# Altium footprint library mmyLibrary.PcbLib: 231 footprints (part 9 of 15)
Each footprint in its own frame and in the unit in brackets; x right, y up, seen from the top. Pads: shape width x height; smd on the part's side, far side on the other; paste and mask are expansions set on the pad; w line width, h text height; cw(c..) or ccw(c..) is an arc to the next point about the centre after c.
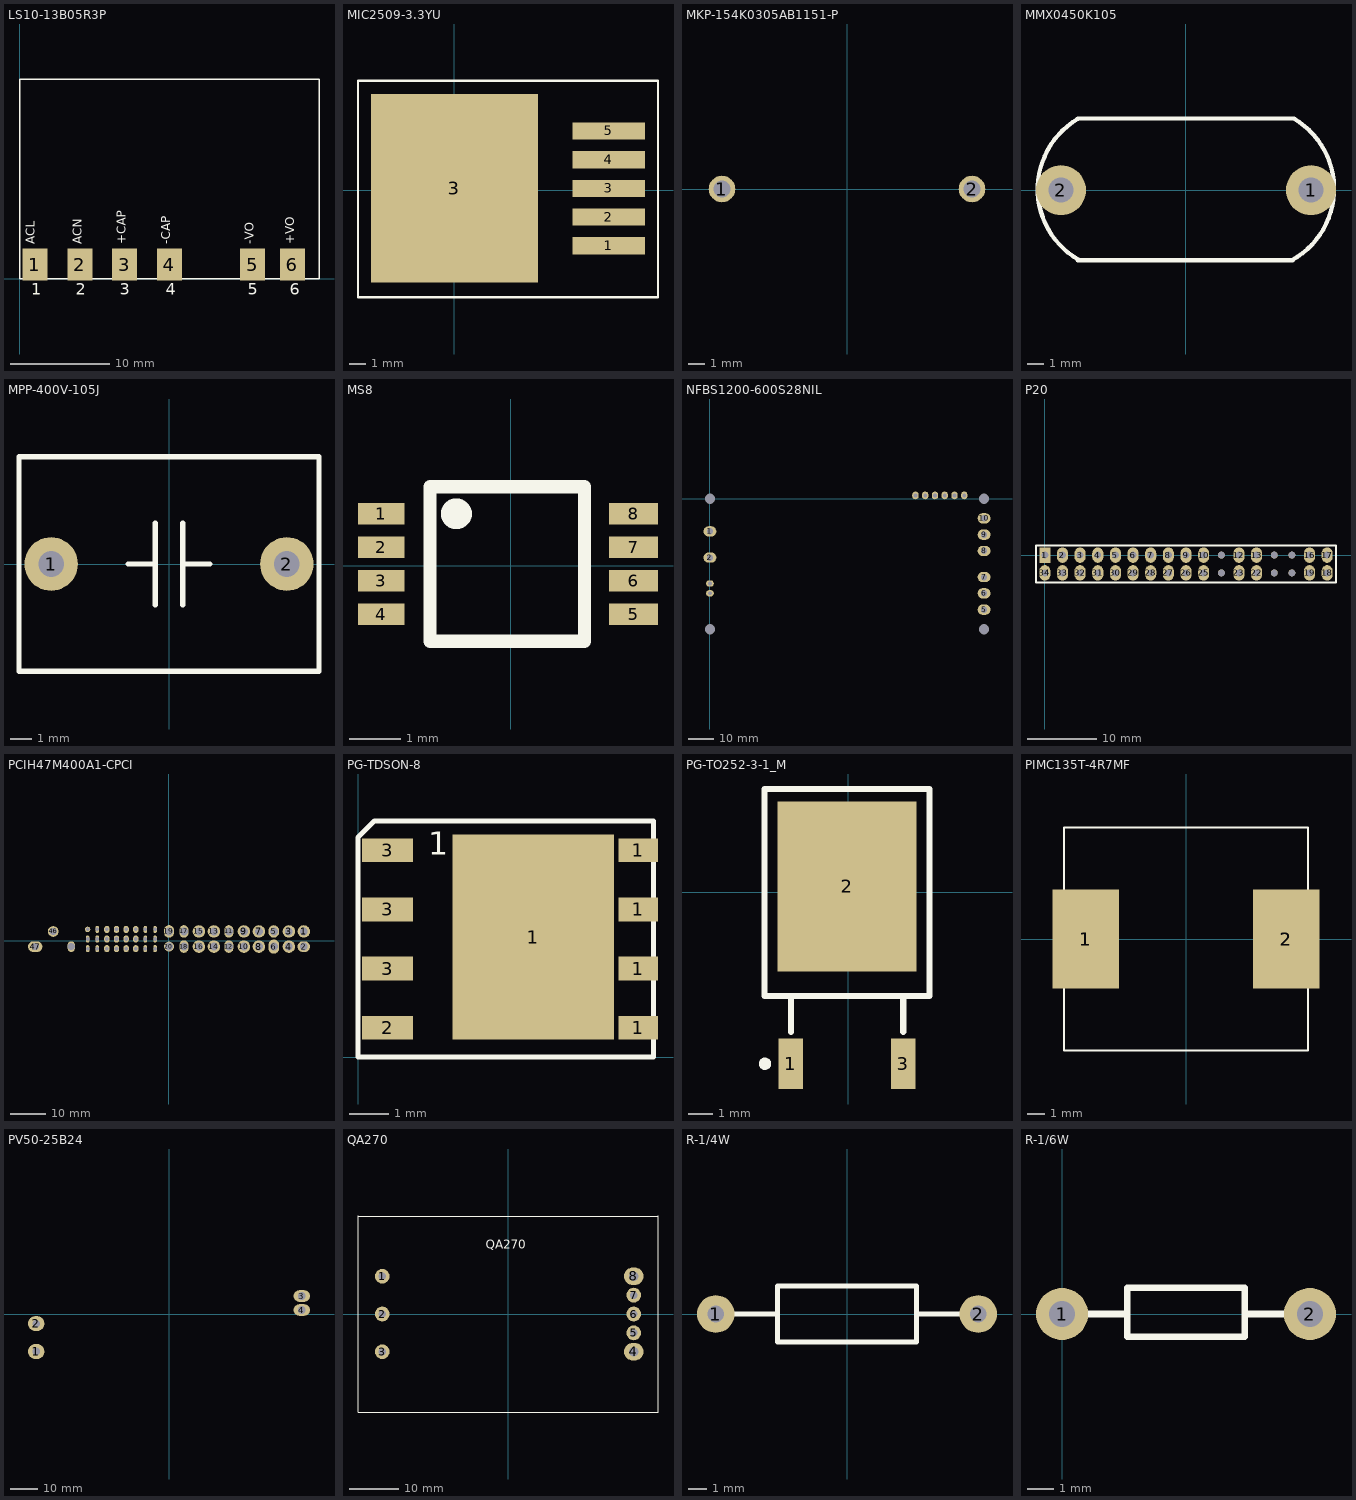
[diagram p8: the footprints below, top view; thin cyan lines are the x and y axes]

## LS10-13B05R3P [mm] "金升阳"
pads (6):
  rect 2.5x3.2 smd: 1(1.5,1.4) 2(6,1.4) 3(10.5,1.4) 4(15,1.4) 5(23.34,1.4) 6(27.34,1.4)
Top Overlay:
  lines w0.127: 0,0 30,0 30,20 0,20 0,0
  text "-CAP" at 15.367,3.429 h1.5
  text "+CAP" at 10.922,3.429 h1.5
  text "ACN" at 6.477,3.429 h1.5
  text "ACL" at 1.778,3.429 h1.5
  text "1" at 1.143,-2.032 h2
  text "2" at 5.588,-2.032 h2
  text "3" at 10.033,-2.032 h2
  text "4" at 14.605,-2.032 h2
  text "5" at 22.86,-2.032 h2
  text "6" at 27.051,-2.032 h2
  text "-VO" at 23.749,3.429 h1.5
  text "+VO" at 27.813,3.429 h1.5

## MIC2509-3.3YU [mm]
pads (6):
  rect 4.32x1.02 smd: 1(9.144,-3.298) 2(9.144,-1.598) 3(9.144,0.102) 4(9.144,1.802) 5(9.144,3.502)
  rect 9.91x11.18 smd: 3(-0.001,0.102)
Top Overlay:
  lines w0.127: -5.715,-6.35 12.065,-6.35 12.065,6.477 -5.715,6.477 -5.715,-6.35

## MKP-154K0305AB1151-P [mm]
pads (2):
  round 1.6 hole 1: 1(-7.5,0) 2(7.5,0)
Bottom Overlay:
  lines w0.254: -6.333,-0.04 -0.745,-0.04 ; -0.745,-1.818 -0.745,1.992 ; 1.16,-1.818 1.16,1.992 ; 1.287,-0.04 6.367,-0.04 ; -9,-2.5 -9,2.5 9,2.5 9,-2.5 -9,-2.5

## MMX0450K105 [mm]
pads (2):
  round 3 hole 1.5: 1(7.5,0) 2(-7.5,0)
Top Overlay:
  lines w0.254: -6.487,4.277 ccw(c-4.014,0.065) -6.442,-4.174 ; 6.347,-4.203 ccw(c4,0.081) 6.49,4.283
  lines w0.256: -6.5,-4.2 6.4,-4.2 ; -6.5,4.3 6.4,4.3

## MPP-400V-105J [mm]
pads (2):
  round 2.5 hole 1.2: 1(-5.5,0) 2(5.5,0)
Top Overlay:
  lines w0.254: -1.905,0 -0.635,0 ; -0.635,-1.905 -0.635,1.905 ; 0.635,-1.905 0.635,1.905 ; 0.635,0 1.905,0 ; -7,-5 7,-5 7,5 -7,5 -7,-5

## MS8 [mm]
pads (8):
  rect 0.9x0.42 smd: 1(-2.52,1.006) 2(-2.52,0.356) 3(-2.52,-0.294) 4(-2.52,-0.944)
  rect 0.95x0.42 smd: 5(2.38,-0.944) 6(2.38,-0.294) 7(2.38,0.356) 8(2.38,1.006)
Top Overlay:
  circle w0.3: c-1.059,1.006 r0.15
  lines w0.254: -1.57,-1.469 1.43,-1.469 1.43,1.531 -1.57,1.531 -1.57,-1.469

## NFBS1200-600S28NIL [mm] "皓文模块"
pads (20):
  round 2.4 hole 4: 0(0,-50.8) 0(0,0) 0(106.7,-50.8) 0(106.7,0)
  oval 5x4 hole 2.5: 1(0,-12.7) 2(0,-22.9) 5(106.7,-43.2) 6(106.7,-36.8) 7(106.7,-30.5) 8(106.7,-20.3) 9(106.7,-14) 10(106.7,-7.6)
  oval 3x2.5 hole 1.5: 3(0,-33) 4(0,-36.8)
  oval 2.5x3 hole 1.5: 11(99,1.3) 12(95.2,1.3) 13(91.4,1.3) 14(87.6,1.3) 15(83.8,1.3) 16(80,1.3)
Bottom Overlay:
  lines w0.127: -5.05,-55.9 -5.05,5.1 111.75,5.1 111.75,-55.9 -5.05,-55.9
  text "-VO" at 97.673,-8.763 h3
  text "-VO" at 97.673,-14.351 h3
  text "-VO" at 97.8,-20.955 h3
  text "+VO" at 97.292,-31.623 h3
  text "+VO" at 97.292,-37.846 h3
  text "+VO" at 97.292,-44.069 h3
  text "+VIN" at 3.82,-23.876 h4
  text "-VIN" at 3.82,-13.716 h4
  text "-ON/OFF" at 2.677,-33.909 h3
  text "+ON/OFF" at 2.55,-37.719 h3
  text "-S" at 99.578,-4.064 h3
  text "+S" at 96.022,-4.572 h3
  text "TRIM" at 92.212,-8.382 h3
  text "PC/NC" at 88.402,-9.271 h3
  text "IOG" at 84.592,-6.731 h3
  text "AUX" at 80.782,-6.985 h3
  text "1" at -4.308,-13.589 h2
  text "2" at -4.308,-23.622 h2
  text "3" at -3.8,-33.909 h2
  text "4" at -3.8,-37.719 h2
  text "5" at 109.992,-43.942 h2
  text "6" at 109.992,-37.592 h2
  text "7" at 109.992,-31.369 h2
  text "8" at 109.992,-20.828 h2
  text "9" at 109.992,-14.986 h2
  text "10" at 109.611,-8.509 h2
  text "11" at 99.578,3.175 h2
  text "12" at 95.895,3.175 h2
  text "13" at 92.085,3.302 h2
  text "14" at 88.275,3.175 h2
  text "15" at 84.338,3.175 h2
  text "16" at 80.528,3.175 h2

## P20 [mm]
pads (34):
  rect 1.6x2.2 hole 1: 1(0,0)
  oval 1.6x2.2 hole 1: 2(2.54,0) 3(5.08,0) 4(7.62,0) 5(10.16,0) 6(12.7,0) 7(15.24,0) 8(17.78,0) 9(20.32,0) 10(22.86,0) 12(27.94,0) 13(30.48,0) 16(38.1,0) 17(40.64,0) 18(40.64,-2.54) 19(38.1,-2.54) 22(30.48,-2.54) 23(27.94,-2.54) 25(22.86,-2.54) 26(20.32,-2.54) 27(17.78,-2.54) 28(15.24,-2.54) 29(12.7,-2.54) 30(10.16,-2.54) 31(7.62,-2.54) 32(5.08,-2.54) 33(2.54,-2.54) 34(0,-2.54)
  round 1 hole 1: 11(25.4,0) 14(33.02,0) 15(35.56,0) 20(35.56,-2.54) 21(33.02,-2.54) 24(25.4,-2.54)
Top Overlay:
  lines w0.254: -1.27,-3.92 41.91,-3.92 41.91,1.38 -1.27,1.38 -1.27,-3.92

## PCIH47M400A1-CPCI [mm]
pads (47):
  round 3.5 hole 2.2: 1(37.8,2.616) 3(33.6,2.616) 4(33.6,-1.634) 7(25.195,2.616) 8(25.195,-1.634) 9(21,2.616) 10(21,-1.634) 13(12.6,2.616) 14(12.6,-1.634) 15(8.4,2.616) 16(8.4,-1.634)
  oval 3.5x3 hole 2.2: 2(37.8,-1.634)
  oval 3x3.5 hole 2.2: 5(29.4,2.616)
  oval 3x4 hole 2.2: 6(29.4,-1.634)
  oval 2.5x3.5 hole 2.2: 11(16.8,2.616) 12(16.8,-1.634) 17(4.2,2.616) 18(4.2,-1.634)
  oval 2.8x3.5 hole 2.2: 19(0,2.616)
  round 2.8 hole 2.2: 20(0,-1.634)
  oval 1x2 hole 1: 21(-3.9,3.191) 22(-3.9,0.491) 23(-3.9,-2.209) 24(-6.6,3.191) 25(-6.6,0.491) 26(-6.6,-2.209) 39(-20.1,3.191) 40(-20.1,0.491) 41(-20.1,-2.209) 43(-22.8,0.491) 44(-22.8,-2.209)
  oval 1.5x2 hole 1: 27(-9.3,3.191) 28(-9.3,0.491) 29(-9.3,-2.209) 30(-12,3.191) 31(-12,0.491) 32(-12,-2.209) 33(-14.7,3.191) 34(-14.7,0.491) 35(-14.7,-2.209) 36(-17.4,3.191) 37(-17.4,0.491) 38(-17.4,-2.209)
  round 1.5 hole 1: 42(-22.8,3.191)
  oval 2x3 hole 2: 45(-27.4,-1.634)
  round 3 hole 2: 46(-32.45,2.616)
  oval 4x3 hole 2: 47(-37.5,-1.634)
Bottom Overlay:
  lines w0.2: -42.037,-5.05 -42.037,6.05 42.063,6.05 42.063,-5.05 -42.037,-5.05

## PG-TDSON-8 [mm] "英飞凌：MOS"
height 9
pads (9):
  rect 4.1x5.2 smd: 1(4.445,3.048)
  rect 1x0.6 smd: 1(7.112,0.75) 1(7.112,2.25) 1(7.112,3.75) 1(7.112,5.25)
  rect 1.3x0.6 smd: 2(0.743,0.75) 3(0.743,2.25) 3(0.743,3.75) 3(0.743,5.25)
Top Overlay:
  lines w0.127: -0.007,0 -0.007,5.581 0.412,6 7.493,6 7.493,0 -0.007,0
  text "1" at 1.778,4.953 h1

## PG-TO252-3-1_M [mm]
pads (3):
  rect 1x2.05 smd: 1(-2.325,-6.959) 3(2.235,-6.959)
  rect 5.65x6.9 smd: 2(-0.045,0.241)
Top Overlay:
  circle w0.25: c-3.375,-6.959 r0.125
  lines w0.2: 3.305,-4.209 3.305,-3.609
  lines w0.254: -2.325,-5.659 -2.325,-4.209 ; 2.235,-5.659 2.235,-4.209 ; -3.395,-4.209 -3.395,4.191 3.305,4.191 3.305,-4.209 -3.395,-4.209

## PIMC135T-4R7MF [mm]
height 5
pads (4):
  rect 3.8x5.7 smd: 1(-5.75,0) 2(5.75,0)
  rect 3.5x5 on Top Solder: 1(-5.75,0) 2(5.75,0)
Top Overlay:
  lines w0.127: -7,-6.4 -7,6.4 7,6.4 7,-6.4 -7,-6.4

## PV50-25B24 [mm] "金升阳/L109mm*W58mm*H30mm"
pads (4):
  oval 6x5.5 hole 2.8: 1(-48.25,-13.65) 2(-48.25,-3.49)
  oval 6x4.2 hole 2.8: 3(48.25,6.53) 4(48.25,1.45)
Bottom Overlay:
  lines w0.127: -54.5,-29.25 -54.5,29.25 54.5,29.25 54.5,-29.25 -54.5,-29.25
  text "+VIN" at -43.942,-4.826 h4
  text "-VIN" at -43.942,-14.986 h4
  text "4" at 52.07,0.254 h4
  text "3" at 52.07,5.334 h4
  text "2" at -53.34,-4.572 h4
  text "1" at -53.34,-14.986 h4
  text "-VO" at 38.1,5.334 h4
  text "+VO" at 37.719,0.254 h4

## QA270 [mm]
pads (8):
  round 3 hole 1.5: 1(-25.4,7.62) 2(-25.4,0) 3(-25.4,-7.62) 5(25.4,-3.81) 6(25.4,0) 7(25.4,3.81)
  oval 4x3.5 hole 2: 4(25.4,-7.62) 8(25.4,7.62)
Top Overlay:
  lines w0.127: -30.3,19.7 30.3,19.7 ; -30.3,19.8 -30.3,-19.8 30.3,-19.8 30.3,19.8
  text "QA270" at -4.445,12.573 h3

## R-1/4W [mm]
pads (2):
  round 2 hole 0.9: 1(-7,0) 2(7,0)
Top Overlay:
  lines w0.254: -7,0 -3.827,0 ; 3.7,0 7,0 ; -3.7,-1.5 -3.7,1.5 3.7,1.5 3.7,-1.5 -3.7,-1.5

## R-1/6W [mm]
pads (2):
  round 2 hole 1: 1(0,0) 2(9.5,0)
Top Overlay:
  lines w0.254: 0,0 2.484,0 ; 7.016,0 9.5,0 ; 2.5,-0.873 7,-0.873 7,1 2.5,1 2.5,-0.873